# Altium footprint library Connectors THD.PcbLib: 631 footprints (part 25 of 46)
Each footprint in its own frame and in the unit in brackets; x right, y up, seen from the top. Pads: shape width x height; smd on the part's side, far side on the other; paste and mask are expansions set on the pad; w line width, h text height; cw(c..) or ccw(c..) is an arc to the next point about the centre after c.
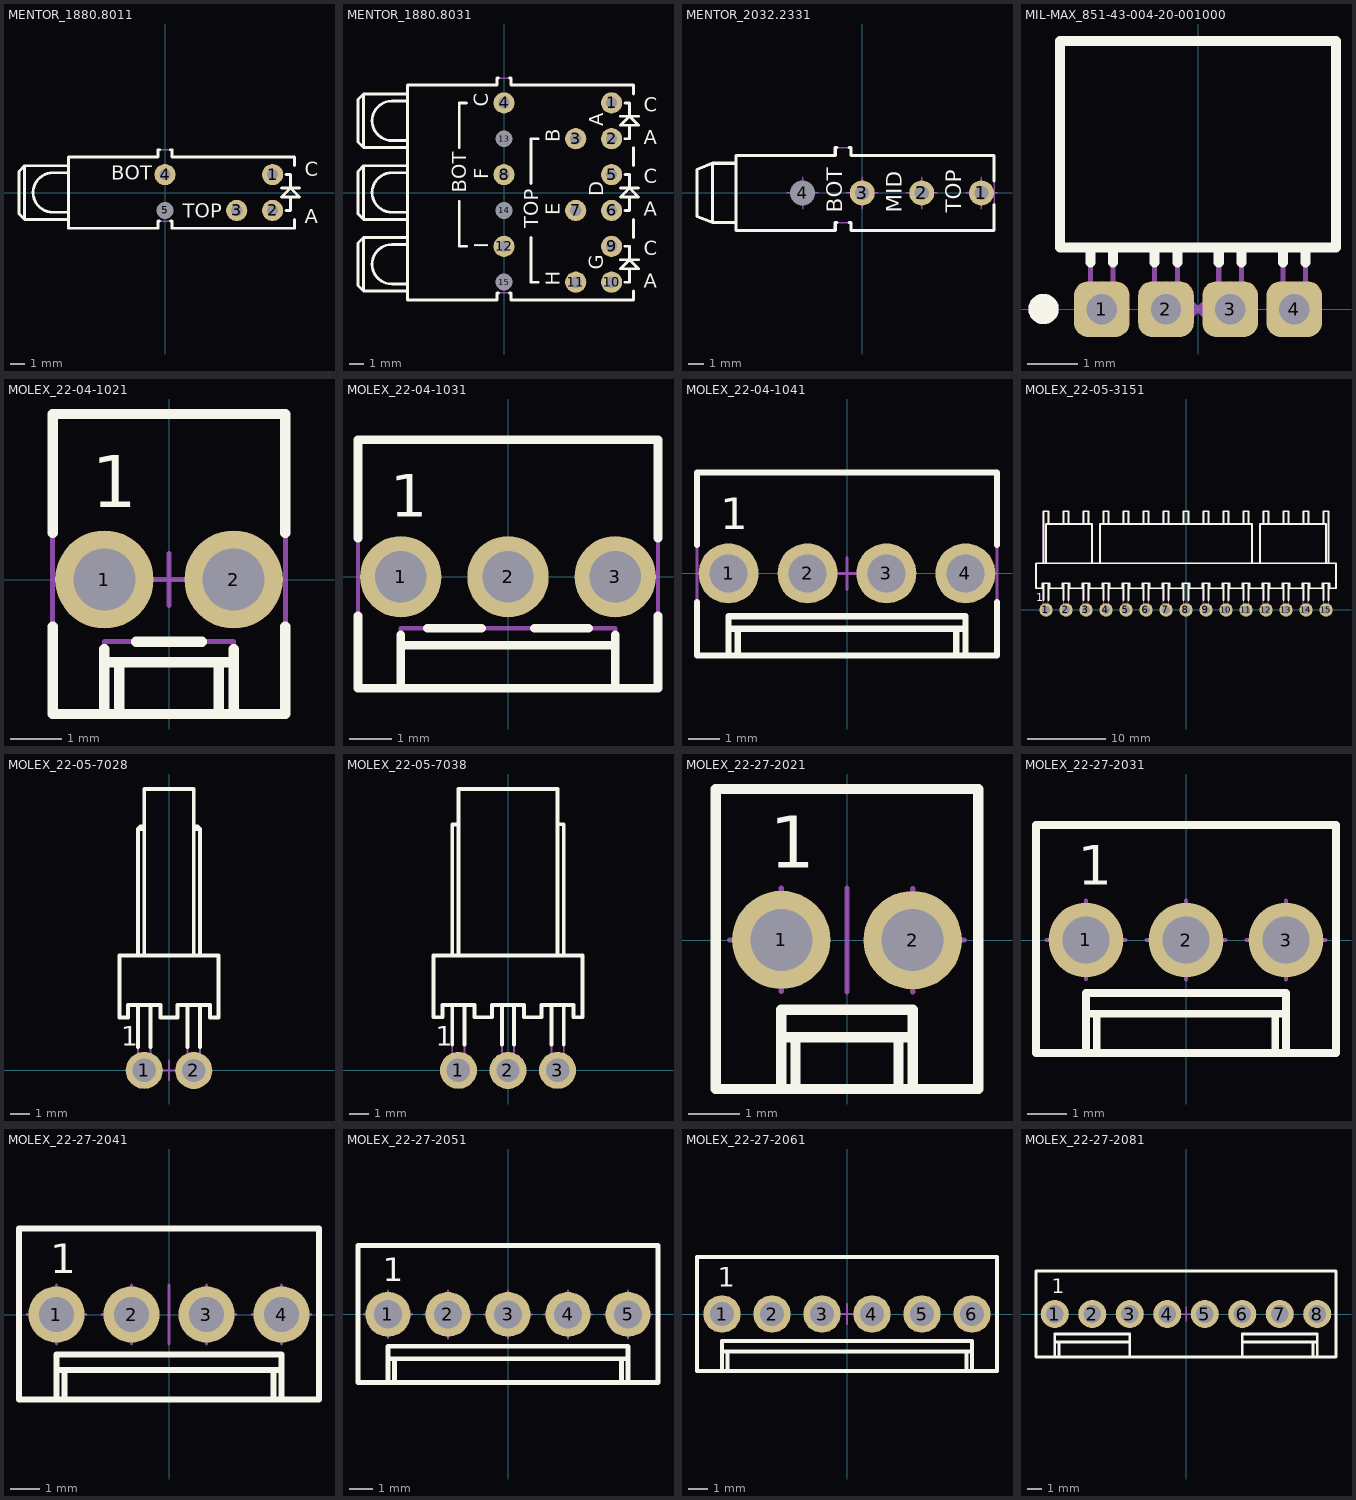
[diagram p24: the footprints below, top view; thin cyan lines are the x and y axes]

## MENTOR_1880.8011 [mm] "2 x Test Jack 2mm + 1 x Green LED 3mm PCB Edge Mounting"
height 15
pads (5):
  round 1.5 hole 0.8: 1(7.62,1.27) 2(7.62,-1.27) 3(5.08,-1.27) 4(0,1.27)
  round 1 hole 1.2 unplated mask+0.2: 5(0,-1.27)
Top Overlay:
  lines w0.2: -6.84,-1.9 -9.94,-1.9 ; -6.84,-1.4 -7.94,-1.4 cw(c-7.94,0) -7.94,1.4 -6.84,1.4 ; -6.84,1.9 -9.94,1.9 ; -0.39,-2.025 -0.5,-2.025 -0.5,-2.525 -6.84,-2.525 -6.84,2.525 -0.5,2.525 -0.5,3.025 -0.39,3.025 ; 0.39,-2.025 0.5,-2.025 0.5,-2.525 9.16,-2.525 9.16,-1.905 ; 0.39,3.025 0.5,3.025 0.5,2.525 9.16,2.525 9.16,1.905 ; 8.255,0.318 9.525,0.318 ; 8.573,-1.27 8.89,-1.27 ; 8.573,1.27 8.89,1.27 8.89,0.318 ; 8.62,-1.27 8.89,-1.27 ; 8.89,-0.318 8.89,-1.27 ; -9.94,-1.9 -9.94,1.9 ; -9.94,-1.9 -10.34,-1.5 -10.34,1.5 -9.94,1.9 ; 8.89,0.318 8.255,-0.318 9.525,-0.318 8.89,0.318
  text "BOT" at -3.81,0.889 h1
  text "TOP" at 1.27,-1.778 h1
  text "A" at 9.906,-2.159 h1
  text "C" at 9.906,1.143 h1
Mechanical 14:
  lines w0.1: -6.84,-1.9 -9.94,-1.9 ; -6.84,1.9 -9.94,1.9 ; 8.255,0.318 9.525,0.318 ; 8.573,-1.27 8.89,-1.27 ; 8.573,1.27 8.89,1.27 8.89,0.318 ; 8.62,-1.27 8.89,-1.27 ; 8.89,-0.318 8.89,-1.27 ; 9.16,-1.905 9.16,-2.525 0.5,-2.525 0.5,-2.025 -0.5,-2.025 -0.5,-2.525 -6.84,-2.525 -6.84,2.525 -0.5,2.525 -0.5,3.025 0.5,3.025 0.5,2.525 9.16,2.525 9.16,1.905 ; -9.94,-1.9 -9.94,1.9 ; -9.94,-1.9 -10.34,-1.5 -10.34,1.5 -9.94,1.9 ; -7.94,-1.4 cw(c-7.94,0) -7.94,1.4 ; -7.94,-1.4 -6.84,-1.4 -7.94,-1.4 ; -7.94,1.4 -6.84,1.4 -7.94,1.4 ; 8.89,0.318 8.255,-0.318 9.525,-0.318 8.89,0.318
  text "A" at 9.906,-2.159 h1
  text "TOP" at 1.27,-1.778 h1
  text "BOT" at -3.81,0.889 h1
  text "C" at 9.906,1.143 h1
3D body: height 15, standoff -3.2, extent -10.3,-2.575 9.2,2.975

## MENTOR_1880.8031 [mm] "6 x Test Jack 2mm + 3 x Green LED 3mm PCB Edge Mounting"
height 15
pads (15):
  round 1.5 hole 0.8: 1(7.62,6.35) 2(7.62,3.81) 3(5.08,3.81) 4(0,6.35) 5(7.62,1.27) 6(7.62,-1.27) 7(5.08,-1.27) 8(0,1.27) 9(7.62,-3.81) 10(7.62,-6.35) 11(5.08,-6.35) 12(0,-3.81)
  round 1 hole 1.2 unplated mask+0.2: 13(0,3.81) 14(0,-1.27) 15(0,-6.35)
Top Overlay:
  lines w0.2: -6.84,-6.98 -9.94,-6.98 ; -6.84,-6.48 -7.94,-6.48 cw(c-7.94,-5.08) -7.94,-3.68 -6.84,-3.68 ; -6.84,-3.18 -9.94,-3.18 ; -6.84,-1.9 -9.94,-1.9 ; -6.84,-1.4 -7.94,-1.4 cw(c-7.94,0) -7.94,1.4 -6.84,1.4 ; -6.84,1.9 -9.94,1.9 ; -6.84,3.18 -9.94,3.18 ; -6.84,3.68 -7.94,3.68 cw(c-7.94,5.08) -7.94,6.48 -6.84,6.48 ; -6.84,6.98 -9.94,6.98 ; -3.175,-0.635 -3.175,-3.81 -2.667,-3.81 ; -3.175,3.175 -3.175,6.35 -2.667,6.35 ; -0.39,-7.105 -0.5,-7.105 -0.5,-7.605 -6.84,-7.605 -6.84,7.605 -0.5,7.605 -0.5,8.105 -0.39,8.105 ; 0.39,-7.105 0.5,-7.105 0.5,-7.605 9.16,-7.605 9.16,-6.985 ; 0.39,8.105 0.5,8.105 0.5,7.605 9.16,7.605 9.16,6.985 ; 1.905,-3.175 1.905,-6.35 2.413,-6.35 ; 1.905,0.635 1.905,3.81 2.413,3.81 ; 8.255,-4.762 9.525,-4.762 ; 8.255,0.318 9.525,0.318 ; 8.255,5.398 9.525,5.398 ; 8.573,-6.35 8.89,-6.35 ; 8.573,-3.81 8.89,-3.81 8.89,-4.762 ; 8.573,-1.27 8.89,-1.27 ; 8.573,1.27 8.89,1.27 8.89,0.318 ; 8.573,3.81 8.89,3.81 ; 8.573,6.35 8.89,6.35 8.89,5.398 ; 8.62,-6.35 8.89,-6.35 ; 8.62,-1.27 8.89,-1.27 ; 8.62,3.81 8.89,3.81 ; 8.89,-5.398 8.89,-6.35 ; 8.89,-0.318 8.89,-1.27 ; 8.89,4.762 8.89,3.81 ; 9.16,-3.175 9.16,-1.905 ; 9.16,1.905 9.16,3.175 ; -9.94,-6.98 -9.94,-3.18 ; -9.94,-6.98 -10.34,-6.58 -10.34,-3.58 -9.94,-3.18 ; -9.94,-1.9 -10.34,-1.5 -10.34,1.5 -9.94,1.9 ; -9.94,-1.9 -9.94,1.9 ; -9.94,3.18 -9.94,6.98 ; -9.94,3.18 -10.34,3.58 -10.34,6.58 -9.94,6.98 ; 8.89,-4.762 8.255,-5.398 9.525,-5.398 8.89,-4.762 ; 8.89,0.318 9.525,-0.318 8.255,-0.318 8.89,0.318 ; 8.89,5.398 8.255,4.762 9.525,4.762 8.89,5.398
  text "BOT" at -2.667,0 h1
  text "C" at -1.116,6.091 h1
  text "I" at -1.116,-3.942 h1
  text "F" at -1.116,0.932 h1
  text "C" at 9.906,0.643 h1
  text "A" at 9.906,-1.659 h1
  text "E" at 3.964,-1.608 h1
  text "H" at 3.964,-6.609 h1
  text "A" at 9.906,-6.739 h1
  text "C" at 9.906,-4.437 h1
  text "B" at 3.964,3.551 h1
  text "A" at 9.906,3.421 h1
  text "C" at 9.906,5.723 h1
  text "A" at 7.012,4.695 h1
  text "D" at 7.012,-0.258 h1
  text "G" at 7.012,-5.465 h1
  text "TOP" at 2.413,-2.54 h1
Mechanical 14:
  lines w0.1: -6.84,-6.98 -9.94,-6.98 ; -6.84,-3.18 -9.94,-3.18 ; -6.84,-1.9 -9.94,-1.9 ; -6.84,1.9 -9.94,1.9 ; -6.84,3.18 -9.94,3.18 ; -6.84,6.98 -9.94,6.98 ; -3.175,-0.635 -3.175,-3.81 -2.667,-3.81 ; -3.175,3.175 -3.175,6.35 -2.667,6.35 ; 1.905,-3.175 1.905,-6.35 2.413,-6.35 ; 1.905,0.635 1.905,3.81 2.413,3.81 ; 8.255,-4.762 9.525,-4.762 ; 8.255,0.318 9.525,0.318 ; 8.255,5.398 9.525,5.398 ; 8.573,-6.35 8.89,-6.35 ; 8.573,-3.81 8.89,-3.81 8.89,-4.762 ; 8.573,-1.27 8.89,-1.27 ; 8.573,1.27 8.89,1.27 8.89,0.318 ; 8.573,3.81 8.89,3.81 ; 8.573,6.35 8.89,6.35 8.89,5.398 ; 8.62,-6.35 8.89,-6.35 ; 8.62,-1.27 8.89,-1.27 ; 8.62,3.81 8.89,3.81 ; 8.89,-5.398 8.89,-6.35 ; 8.89,-0.318 8.89,-1.27 ; 8.89,4.762 8.89,3.81 ; 9.16,-6.985 9.16,-7.605 0.5,-7.605 0.5,-7.105 -0.5,-7.105 -0.5,-7.605 -6.84,-7.605 -6.84,7.605 -0.5,7.605 -0.5,8.105 0.5,8.105 0.5,7.605 9.16,7.605 9.16,6.985 ; 9.16,-3.175 9.16,-1.905 ; 9.16,1.905 9.16,3.175 ; -9.94,-6.98 -9.94,-3.18 ; -9.94,-6.98 -10.34,-6.58 -10.34,-3.58 -9.94,-3.18 ; -9.94,-1.9 -10.34,-1.5 -10.34,1.5 -9.94,1.9 ; -9.94,-1.9 -9.94,1.9 ; -9.94,3.18 -9.94,6.98 ; -9.94,3.18 -10.34,3.58 -10.34,6.58 -9.94,6.98 ; -7.94,-6.48 cw(c-7.94,-5.08) -7.94,-3.68 ; -7.94,-6.48 -6.84,-6.48 -7.94,-6.48 ; -7.94,-3.68 -6.84,-3.68 -7.94,-3.68 ; -7.94,-1.4 cw(c-7.94,0) -7.94,1.4 ; -7.94,-1.4 -6.84,-1.4 -7.94,-1.4 ; -7.94,1.4 -6.84,1.4 -7.94,1.4 ; -7.94,3.68 cw(c-7.94,5.08) -7.94,6.48 ; -7.94,3.68 -6.84,3.68 -7.94,3.68 ; -7.94,6.48 -6.84,6.48 -7.94,6.48 ; 8.89,-4.762 8.255,-5.398 9.525,-5.398 8.89,-4.762 ; 8.89,0.318 9.525,-0.318 8.255,-0.318 8.89,0.318 ; 8.89,5.398 8.255,4.762 9.525,4.762 8.89,5.398
  text "BOT" at -2.667,0 h1
  text "C" at -1.116,6.091 h1
  text "I" at -1.116,-3.942 h1
  text "F" at -1.116,0.932 h1
  text "E" at 3.964,-1.608 h1
  text "A" at 9.906,-1.659 h1
  text "C" at 9.906,0.643 h1
  text "C" at 9.906,-4.437 h1
  text "A" at 9.906,-6.739 h1
  text "H" at 3.964,-6.609 h1
  text "C" at 9.906,5.723 h1
  text "A" at 9.906,3.421 h1
  text "B" at 3.964,3.551 h1
  text "A" at 7.012,4.695 h1
  text "D" at 7.012,-0.258 h1
  text "G" at 7.012,-5.465 h1
  text "TOP" at 2.413,-2.54 h1
3D body: height 15, standoff -3.1, extent -10.34,-7.6 9.16,8.1

## MENTOR_2032.2331 [mm] "3 x Right Angled Test Jack 2mm"
height 15.1
pads (4):
  round 1.6 hole 0.9: 1(7.62,0) 2(3.81,0) 3(0,0)
  round 1.4 hole 1.6 unplated mask+0.2: 4(-3.81,0)
Top Overlay:
  lines w0.2: -8.06,-1.9 -9.56,-1.9 ; -8.06,1.9 -9.56,1.9 ; -1.61,-1.9 -1.72,-1.9 -1.72,-2.4 -8.06,-2.4 -8.06,2.4 -1.72,2.4 -1.72,2.9 -1.61,2.9 ; -0.83,-1.9 -0.72,-1.9 -0.72,-2.4 8.44,-2.4 8.44,-0.75 ; -0.83,2.9 -0.72,2.9 -0.72,2.4 8.44,2.4 8.44,0.75 ; -9.56,-1.9 -9.56,1.9 ; -9.56,-1.9 -10.56,-1.5 -10.56,1.5 -9.56,1.9
  text "BOT" at -1.27,-1.27 h1
  text "TOP" at 6.35,-1.27 h1
  text "MID" at 2.54,-1.27 h1
Mechanical 8:
  lines w0.1: -4.81,0 -3.81,0 ; -3.81,-1 -3.81,0 ; -3.81,1 -3.81,0 ; -2.81,0 -3.81,0 ; -1,0 0,0 ; 0,-1 0,0 ; 0,1 0,0 ; 1,0 0,0 ; 2.81,0 3.81,0 ; 3.81,-1 3.81,0 ; 3.81,1 3.81,0 ; 4.81,0 3.81,0 ; 6.62,0 7.62,0 ; 7.62,-1 7.62,0 ; 7.62,1 7.62,0 ; 8.62,0 7.62,0
Mechanical 14:
  lines w0.1: -8.06,-1.9 -9.56,-1.9 ; -8.06,1.9 -9.56,1.9 ; -9.56,-1.9 -9.56,1.9 ; -9.56,-1.9 -10.56,-1.5 -10.56,1.5 -9.56,1.9 ; -8.06,-2.4 -8.06,2.4 -1.72,2.4 -1.72,2.9 -0.72,2.9 -0.72,2.4 8.44,2.4 8.44,-2.4 -0.72,-2.4 -0.72,-1.9 -1.72,-1.9 -1.72,-2.4 -8.06,-2.4
  text "TOP" at -1.27,-1.27 h1
  text "BOT" at 6.35,-1.27 h1
  text "MID" at 2.54,-1.27 h1
3D body: height 15.1, standoff -3.2, extent -10.56,-2.4 8.44,2.9

## MIL-MAX_851-43-004-20-001000 [mm] "1.27mm Pitch SIL Right Angled Socket"
height 2.21
pads (4):
  rrect50% 1.1x1.1 hole 0.6: 1(-1.905,0) 2(-0.635,0) 3(0.635,0) 4(1.905,0)
Top Overlay:
  circle w0.3: c-3.058,0.003 r0.15
  lines w0.2: -2.129,0.923 -2.129,1.218 ; -1.68,0.923 -1.68,1.218 ; -0.859,0.923 -0.859,1.218 ; -0.41,0.923 -0.41,1.218 ; 0.41,0.923 0.41,1.218 ; 0.86,0.923 0.86,1.218 ; 1.68,0.923 1.68,1.218 ; 2.13,0.923 2.13,1.218 ; -2.731,1.218 -2.73,5.308 0,5.308 2.73,5.308 2.731,1.218 -2.731,1.218
Mechanical 8:
  lines w0.1: -2.405,0 -1.905,0 ; -1.905,-0.5 -1.905,0 ; -1.905,0.5 -1.905,0 ; -1.405,0 -1.905,0 ; -1.135,0 -0.635,0 ; -0.635,-0.5 -0.635,0 ; -0.635,0.5 -0.635,0 ; -0.354,-0.354 0,0 ; -0.354,0.354 0,0 ; -0.135,0 -0.635,0 ; 0.135,0 0.635,0 ; 0.354,-0.354 0,0 ; 0.354,0.354 0,0 ; 0.635,-0.5 0.635,0 ; 0.635,0.5 0.635,0 ; 1.135,0 0.635,0 ; 1.405,0 1.905,0 ; 1.905,-0.5 1.905,0 ; 1.905,0.5 1.905,0 ; 2.405,0 1.905,0
Mechanical 14:
  circle w0.3: c-3.058,0.003 r0.15
  lines w0.1: -2.129,1.218 -2.13,0 ccw(c-1.905,0) -1.68,0 -1.68,1.218 ; -0.859,1.218 -0.86,0 ccw(c-0.635,0) -0.41,0 -0.41,1.218 ; 0.41,1.218 0.41,0 ccw(c0.635,0) 0.86,0 0.86,1.218 ; 1.68,1.218 1.68,0 ccw(c1.905,0) 2.13,0 2.13,1.218 ; -2.731,1.218 -2.73,5.308 0,5.308 2.73,5.308 2.731,1.218 -2.731,1.218
3D body: height 2.21, standoff -3.6, extent -2.73,-0.225 2.731,5.308

## MOLEX_22-04-1021 [mm] "2.5mm (.100\") Pitch KK® Header, Single Row, Vertical, 2 Circuits"
height 11.7
pads (2):
  round 1.9 hole 1.2: 1(-1.25,0) 2(1.25,0)
Top Overlay:
  lines w0.2: -2.25,-0.907 -2.25,-2.6 2.25,-2.6 2.25,-0.907 ; -2.25,0.907 -2.25,3.2 2.25,3.2 2.25,0.907 ; -1.25,-2.6 -1.25,-1.35 ; -1.25,-1.6 1.25,-1.6 ; -0.959,-2.6 -0.959,-1.6 ; -0.632,-1.2 0.632,-1.2 ; 0.959,-2.6 0.959,-1.6 ; 1.25,-2.6 1.25,-1.35
  text "1" at -1.49,1.397 h1
Mechanical 8:
  lines w0.1: -1.75,0 -1.25,0 ; -1.25,-0.5 -1.25,0 ; -1.25,0.5 -1.25,0 ; -0.75,0 -1.25,0 ; -0.5,0 0,0 ; 0,-0.5 0,0 ; 0,0.5 0,0 ; 0.5,0 0,0 ; 0.75,0 1.25,0 ; 1.25,-0.5 1.25,0 ; 1.25,0.5 1.25,0 ; 1.75,0 1.25,0
Mechanical 14:
  lines w0.1: -1.25,-2.6 -1.25,-1.2 1.25,-1.2 1.25,-2.6 ; -1.25,-1.6 1.25,-1.6 ; -0.959,-2.6 -0.959,-1.6 ; 0.959,-2.6 0.959,-1.6 ; -2.25,-2.6 2.25,-2.6 2.25,3.2 -2.25,3.2 -2.25,-2.6 ; -1.568,-0.318 -0.933,-0.318 -0.933,0.318 -1.568,0.318 -1.568,-0.318 ; 0.933,-0.318 0.933,0.318 1.568,0.318 1.568,-0.318 0.933,-0.318
  text "1" at -1.49,1.397 h1
3D body: height 11.7, standoff -3.4, extent -2.25,-2.6 2.25,3.2

## MOLEX_22-04-1031 [mm] "2.5mm (.100\") Pitch KK® Header, Single Row, Vertical, 3 Circuits"
height 11.7
pads (3):
  round 1.9 hole 1.2: 1(-2.5,0) 2(0,0) 3(2.5,0)
Top Overlay:
  lines w0.2: -3.5,-0.907 -3.5,-2.6 3.5,-2.6 3.5,-0.907 ; -3.5,0.907 -3.5,3.2 3.5,3.2 3.5,0.907 ; -2.5,-2.6 -2.5,-1.35 ; -2.5,-1.6 2.5,-1.6 ; -1.882,-1.2 -0.618,-1.2 ; 0.618,-1.2 1.882,-1.2 ; 2.5,-2.6 2.5,-1.35
  text "1" at -2.75,1.4 h1
Mechanical 8:
  lines w0.1: -3,0 -2.5,0 ; -2.5,-0.5 -2.5,0 ; -2.5,0.5 -2.5,0 ; -2,0 -2.5,0 ; -0.5,0 0,0 ; 0,-0.5 0,0 ; 0,0.5 0,0 ; 0.5,0 0,0 ; 2,0 2.5,0 ; 2.5,-0.5 2.5,0 ; 2.5,0.5 2.5,0 ; 3,0 2.5,0
Mechanical 14:
  lines w0.1: -2.5,-2.6 -2.5,-1.2 2.5,-1.2 2.5,-2.6 ; -2.5,-1.6 2.5,-1.6 ; -3.5,-2.6 3.5,-2.6 3.5,3.2 -3.5,3.2 -3.5,-2.6
  text "1" at -2.75,1.4 h1
3D body: height 11.7, standoff -3.4, extent -3.5,-2.6 3.5,3.2

## MOLEX_22-04-1041 [mm] "2.5mm (.100\") Pitch KK® Header, Single Row, Vertical, 4 Circuits"
height 11.7
pads (4):
  round 1.9 hole 1.2: 1(-3.75,0) 2(-1.25,0) 3(1.25,0) 4(3.75,0)
Top Overlay:
  lines w0.2: -4.75,-0.907 -4.75,-2.6 4.75,-2.6 4.75,-0.907 ; -4.75,0.907 -4.75,3.2 4.75,3.2 4.75,0.907 ; -3.75,-2.6 -3.75,-1.35 3.75,-1.35 3.75,-2.6 ; -3.75,-1.75 3.75,-1.75 ; -3.459,-2.6 -3.459,-1.75 ; 3.459,-2.6 3.459,-1.75
  text "1" at -4.02,1.395 h1
Mechanical 8:
  lines w0.1: -4.25,0 -3.75,0 ; -3.75,-0.5 -3.75,0 ; -3.75,0.5 -3.75,0 ; -3.25,0 -3.75,0 ; -1.75,0 -1.25,0 ; -1.25,-0.5 -1.25,0 ; -1.25,0.5 -1.25,0 ; -0.75,0 -1.25,0 ; -0.5,0 0,0 ; 0,-0.5 0,0 ; 0,0.5 0,0 ; 0.5,0 0,0 ; 0.75,0 1.25,0 ; 1.25,-0.5 1.25,0 ; 1.25,0.5 1.25,0 ; 1.75,0 1.25,0 ; 3.25,0 3.75,0 ; 3.75,-0.5 3.75,0 ; 3.75,0.5 3.75,0 ; 4.25,0 3.75,0
Mechanical 14:
  lines w0.1: -3.75,-2.6 -3.75,-1.35 3.75,-1.35 3.75,-2.6 ; -3.75,-1.75 3.75,-1.75 ; -3.459,-2.6 -3.459,-1.75 ; 3.459,-2.6 3.459,-1.75 ; -4.75,-2.6 -4.75,3.2 4.75,3.2 4.75,-2.6 -4.75,-2.6
  text "1" at -4.02,1.395 h1
3D body: height 11.7, standoff -3.4, extent -4.75,-2.6 4.75,3.2

## MOLEX_22-05-3151 [mm] "2.54mm (.100\") Pitch KK® Wire-To-Board Header, Right Angle, With Friction Lock, 15 Circuits"
height 6.6
pads (15):
  round 1.7 hole 1: 1(-17.78,0) 2(-15.24,0) 3(-12.7,0) 4(-10.16,0) 5(-7.62,0) 6(-5.08,0) 7(-2.54,0) 8(0,0) 9(2.54,0) 10(5.08,0) 11(7.62,0) 12(10.16,0) 13(12.7,0) 14(15.24,0) 15(17.78,0)
Top Overlay:
  lines w0.2: -18.098,1.25 -18.098,3.366 ; -18.098,5.906 -18.098,12.51 -17.463,12.51 -17.463,10.909 ; -17.78,5.906 -17.78,10.909 -11.938,10.909 -11.938,5.906 ; -17.463,1.25 -17.463,3.366 ; -15.558,1.25 -15.558,3.366 ; -15.558,10.909 -15.558,12.51 -14.923,12.51 -14.923,10.909 ; -14.923,1.25 -14.923,3.366 ; -13.018,1.25 -13.018,3.366 ; -13.018,10.909 -13.018,12.51 -12.383,12.51 -12.383,10.909 ; -12.383,1.25 -12.383,3.366 ; -10.922,5.906 -10.922,10.909 8.382,10.909 8.382,5.906 ; -10.478,1.25 -10.478,3.366 ; -10.478,10.909 -10.478,12.51 -9.843,12.51 -9.843,10.909 ; -9.843,1.25 -9.843,3.366 ; -7.938,1.25 -7.938,3.366 ; -7.938,10.909 -7.938,12.51 -7.303,12.51 -7.303,10.909 ; -7.303,1.25 -7.303,3.366 ; -5.398,1.25 -5.398,3.366 ; -5.398,10.909 -5.398,12.51 -4.763,12.51 -4.763,10.909 ; -4.763,1.25 -4.763,3.366 ; -2.858,1.25 -2.858,3.366 ; -2.858,10.909 -2.858,12.51 -2.222,12.51 -2.222,10.909 ; -2.222,1.25 -2.222,3.366 ; -0.318,1.25 -0.318,3.366 ; -0.318,10.909 -0.318,12.51 0.318,12.51 0.318,10.909 ; 0.318,1.25 0.318,3.366 ; 2.222,1.25 2.222,3.366 ; 2.222,10.909 2.222,12.51 2.858,12.51 2.858,10.909 ; 2.858,1.25 2.858,3.366 ; 4.763,1.25 4.763,3.366 ; 4.763,10.909 4.763,12.51 5.398,12.51 5.398,10.909 ; 5.398,1.25 5.398,3.366 ; 7.303,1.25 7.303,3.366 ; 7.303,10.909 7.303,12.51 7.938,12.51 7.938,10.909 ; 7.938,1.25 7.938,3.366 ; 9.398,5.906 9.398,10.909 17.78,10.909 17.78,5.906 ; 9.843,1.25 9.843,3.366 ; 9.843,10.909 9.843,12.51 10.478,12.51 10.478,10.909 ; 10.478,1.25 10.478,3.366 ; 12.383,1.25 12.383,3.366 ; 12.383,10.909 12.383,12.51 13.018,12.51 13.018,10.909 ; 13.018,1.25 13.018,3.366 ; 14.923,1.25 14.923,3.366 ; 14.923,10.909 14.923,12.51 15.558,12.51 15.558,10.909 ; 15.558,1.25 15.558,3.366 ; 17.463,1.25 17.463,3.366 ; 17.463,10.909 17.463,12.51 18.098,12.51 18.098,5.906 ; 18.098,1.25 18.098,3.366 ; -19.05,2.731 -18.225,2.731 -18.225,3.366 -17.336,3.366 -17.336,2.731 -15.685,2.731 -15.685,3.366 -14.796,3.366 -14.796,2.731 -13.145,2.731 -13.145,3.366 -12.256,3.366 -12.256,2.731 -10.605,2.731 -10.605,3.366 -9.716,3.366 -9.716,2.731 -8.065,2.731 -8.065,3.366 -7.176,3.366 -7.176,2.731 -5.525,2.731 -5.525,3.366 -4.636,3.366 -4.636,2.731 -2.985,2.731 -2.985,3.366 -2.095,3.366 -2.095,2.731 -0.445,2.731 -0.445,3.366 0.445,3.366 0.445,2.731 2.095,2.731 2.095,3.366 2.985,3.366 2.985,2.731 4.636,2.731 4.636,3.366 5.525,3.366 5.525,2.731 7.176,2.731 7.176,3.366 8.065,3.366 8.065,2.731 9.716,2.731 9.716,3.366 10.605,3.366 10.605,2.731 12.256,2.731 12.256,3.366 13.145,3.366 13.145,2.731 14.796,2.731 14.796,3.366 15.685,3.366 15.685,2.731 17.336,2.731 17.336,3.366 18.225,3.366 18.225,2.731 19.05,2.731 19.05,5.906 -19.05,5.906 -19.05,2.731
  text "1" at -19.028,1.12 h1
Mechanical 8:
  lines w0.1: -18.28,0 -17.78,0 ; -17.78,-0.5 -17.78,0 ; -17.78,0.5 -17.78,0 ; -17.28,0 -17.78,0 ; -15.74,0 -15.24,0 ; -15.24,-0.5 -15.24,0 ; -15.24,0.5 -15.24,0 ; -14.74,0 -15.24,0 ; -13.2,0 -12.7,0 ; -12.7,-0.5 -12.7,0 ; -12.7,0.5 -12.7,0 ; -12.2,0 -12.7,0 ; -10.66,0 -10.16,0 ; -10.16,-0.5 -10.16,0 ; -10.16,0.5 -10.16,0 ; -9.66,0 -10.16,0 ; -8.12,0 -7.62,0 ; -7.62,-0.5 -7.62,0 ; -7.62,0.5 -7.62,0 ; -7.12,0 -7.62,0 ; -5.58,0 -5.08,0 ; -5.08,-0.5 -5.08,0 ; -5.08,0.5 -5.08,0 ; -4.58,0 -5.08,0 ; -3.04,0 -2.54,0 ; -2.54,-0.5 -2.54,0 ; -2.54,0.5 -2.54,0 ; -2.04,0 -2.54,0 ; -0.5,0 0,0 ; 0,-0.5 0,0 ; 0,0.5 0,0 ; 0.5,0 0,0 ; 2.04,0 2.54,0 ; 2.54,-0.5 2.54,0 ; 2.54,0.5 2.54,0 ; 3.04,0 2.54,0 ; 4.58,0 5.08,0 ; 5.08,-0.5 5.08,0 ; 5.08,0.5 5.08,0 ; 5.58,0 5.08,0 ; 7.12,0 7.62,0 ; 7.62,-0.5 7.62,0 ; 7.62,0.5 7.62,0 ; 8.12,0 7.62,0 ; 9.66,0 10.16,0 ; 10.16,-0.5 10.16,0 ; 10.16,0.5 10.16,0 ; 10.66,0 10.16,0 ; 12.2,0 12.7,0 ; 12.7,-0.5 12.7,0 ; 12.7,0.5 12.7,0 ; 13.2,0 12.7,0 ; 14.74,0 15.24,0 ; 15.24,-0.5 15.24,0 ; 15.24,0.5 15.24,0 ; 15.74,0 15.24,0 ; 17.28,0 17.78,0 ; 17.78,-0.5 17.78,0 ; 17.78,0.5 17.78,0 ; 18.28,0 17.78,0
Mechanical 14:
  drawing of 163 lines, arcs and shapes, not listed
  text "1" at -19.028,1.12 h1
3D body: height 6.35, standoff -3.58, extent -19.05,-0.317 19.05,12.51

## MOLEX_22-05-7028 [mm] "2.54mm (.100\") Pitch KK® Wire-To-Board Header, Right Angle, With Friction Lock, 2 Circuits"
height 5.8
pads (2):
  round 1.9 hole 1.2: 1(-1.27,0.002) 2(1.27,-0.002)
Top Overlay:
  lines w0.2: -1.587,1.209 -1.587,3.355 ; -1.587,5.895 -1.587,12.368 ; -1.27,5.895 -1.27,14.42 1.27,14.42 1.27,5.895 ; -1.27,12.368 -1.587,12.368 ; -1.27,12.495 -1.46,12.495 -1.587,12.368 ; -0.953,1.209 -0.953,3.355 ; 0.953,1.209 0.953,3.355 ; 1.27,12.368 1.587,12.368 ; 1.27,12.495 1.46,12.495 1.587,12.368 ; 1.587,1.209 1.587,3.355 ; 1.587,5.895 1.587,12.368 ; -2.54,2.72 -2.095,2.72 -2.095,3.355 -0.445,3.355 -0.445,2.72 0.445,2.72 0.445,3.355 2.095,3.355 2.095,2.72 2.54,2.72 2.54,5.895 -2.54,5.895 -2.54,2.72
  text "1" at -2.442,1.27 h1
Mechanical 8:
  lines w0.1: -1.77,0 -1.27,0 ; -1.27,-0.5 -1.27,0 ; -1.27,0.5 -1.27,0 ; -0.77,0 -1.27,0 ; -0.5,0 0,0 ; 0,-0.5 0,0 ; 0,0.5 0,0 ; 0.5,0 0,0 ; 0.77,0 1.27,0 ; 1.27,-0.5 1.27,0 ; 1.27,0.5 1.27,0 ; 1.77,0 1.27,0
Mechanical 14:
  lines w0.1: -1.587,3.355 -1.587,-0.318 -0.953,-0.318 -0.953,3.355 ; -1.587,5.895 -1.587,12.368 ; -1.27,5.895 -1.27,14.42 1.27,14.42 1.27,5.895 ; -1.27,12.368 -1.587,12.368 ; -1.27,12.495 -1.46,12.495 -1.587,12.368 ; 0.953,3.355 0.953,-0.318 1.587,-0.318 1.587,3.355 ; 1.27,12.368 1.587,12.368 ; 1.27,12.495 1.46,12.495 1.587,12.368 ; 1.587,5.895 1.587,12.368 ; -2.54,2.72 -2.095,2.72 -2.095,3.355 -0.445,3.355 -0.445,2.72 0.445,2.72 0.445,3.355 2.095,3.355 2.095,2.72 2.54,2.72 2.54,5.895 -2.54,5.895 -2.54,2.72
  text "1" at -2.442,1.27 h1
3D body: height 5.84, standoff -3.8, extent -2.54,-0.317 2.54,14.42

## MOLEX_22-05-7038 [mm] "2.54mm (.100\") Pitch KK® Wire-To-Board Header, Right Angle, With Friction Lock, 3 Circuits"
height 5.8
pads (3):
  round 1.9 hole 1.2: 1(-2.54,0) 2(0,-0.005) 3(2.54,0)
Top Overlay:
  lines w0.2: -2.858,1.312 -2.858,3.355 ; -2.858,5.895 -2.858,12.605 -2.54,12.605 ; -2.54,5.895 -2.54,14.42 2.54,14.42 2.54,5.895 ; -2.222,1.312 -2.222,3.355 ; -0.318,1.312 -0.318,3.355 ; 0.318,1.312 0.318,3.355 ; 2.222,1.312 2.222,3.355 ; 2.54,12.634 2.858,12.605 2.858,5.895 ; 2.858,1.312 2.858,3.355 ; -3.81,2.72 -3.81,5.895 ; -3.81,2.72 -3.366,2.72 -3.366,3.355 -1.714,3.355 -1.714,2.72 -0.826,2.72 -0.826,3.355 0.826,3.355 0.826,2.72 1.714,2.72 1.714,3.355 3.366,3.355 3.366,2.72 3.81,2.72 3.81,5.895 -3.81,5.895 ; -3.81,2.72 -3.81,5.895
  text "1" at -3.712,1.268 h1
Mechanical 8:
  lines w0.1: -3.04,0 -2.54,0 ; -2.54,-0.5 -2.54,0 ; -2.54,0.5 -2.54,0 ; -2.04,0 -2.54,0 ; -0.5,0 0,0 ; 0,-0.5 0,0 ; 0,0.5 0,0 ; 0.5,0 0,0 ; 2.04,0 2.54,0 ; 2.54,-0.5 2.54,0 ; 2.54,0.5 2.54,0 ; 3.04,0 2.54,0
Mechanical 14:
  lines w0.1: -2.858,3.355 -2.858,-0.318 -2.222,-0.318 -2.222,3.355 ; -2.858,5.895 -2.858,12.605 -2.54,12.605 ; -2.54,5.895 -2.54,14.42 2.54,14.42 2.54,5.895 ; -0.318,3.355 -0.318,-0.318 0.318,-0.318 0.318,3.355 ; 2.222,3.355 2.222,-0.318 2.858,-0.318 2.858,3.355 ; 2.54,12.634 2.858,12.605 2.858,5.895 ; -3.81,2.72 -3.81,5.895 ; -3.81,2.72 -3.366,2.72 -3.366,3.355 -1.714,3.355 -1.714,2.72 -0.826,2.72 -0.826,3.355 0.826,3.355 0.826,2.72 1.714,2.72 1.714,3.355 3.366,3.355 3.366,2.72 3.81,2.72 3.81,5.895 -3.81,5.895 ; -3.81,2.72 -3.81,5.895
  text "1" at -3.712,1.268 h1
3D body: height 5.84, standoff -3.8, extent -3.81,-0.317 3.81,14.42

## MOLEX_22-27-2021 [mm] "2.54mm (.100\") Pitch KK® Header, Single Row, Vertical, 2 Circuits"
height 11.7
pads (2):
  round 1.9 hole 1.2: 1(-1.27,0.002) 2(1.27,-0.002)
Top Overlay:
  lines w0.2: -1.27,-2.88 -1.27,-1.35 1.27,-1.35 1.27,-2.88 ; -1.27,-1.88 1.27,-1.88 ; -0.997,-2.88 -0.997,-1.88 ; 0.997,-2.88 0.997,-1.88 ; -2.54,-2.88 2.54,-2.88 2.54,2.92 -2.54,2.92 -2.54,-2.88
  text "1" at -1.49,1.397 h1
Mechanical 8:
  lines w0.1: -2.27,0.002 -1.27,0.002 ; -1.27,-0.998 -1.27,0.002 ; -1.27,1.002 -1.27,0.002 ; 0,-1 0,0 0,1 ; 1.27,-1.002 1.27,-0.002 ; 1.27,0.998 1.27,-0.002 ; 2.27,-0.002 1.27,-0.002
Mechanical 14:
  lines w0.1: -1.27,-2.88 -1.27,-1.35 1.27,-1.35 1.27,-2.88 ; -1.27,-1.88 1.27,-1.88 ; -0.997,-2.88 -0.997,-1.88 ; 0.997,-2.88 0.997,-1.88 ; -2.54,-2.88 2.54,-2.88 2.54,2.92 -2.54,2.92 -2.54,-2.88 ; -1.59,-0.315 -0.95,-0.315 -0.95,0.32 -1.59,0.32 -1.59,-0.315 ; 0.95,-0.32 0.95,0.32 1.59,0.32 1.59,-0.32 0.95,-0.32
  text "1" at -1.49,1.397 h1
3D body: height 11.7, standoff -3.56, extent -2.54,-2.88 2.54,2.92

## MOLEX_22-27-2031 [mm] "2.54mm (.100\") Pitch KK® Header, Single Row, Vertical, 3 Circuits"
height 11.7
pads (3):
  round 1.9 hole 1.2: 1(-2.54,0.005) 2(0,0) 3(2.54,0)
Top Overlay:
  lines w0.2: -2.54,-2.873 -2.54,-1.342 2.54,-1.342 2.54,-2.873 ; -2.54,-1.873 2.54,-1.873 ; -2.267,-2.873 -2.267,-1.873 ; 2.267,-2.873 2.267,-1.873 ; -3.81,-2.873 -3.81,2.928 3.81,2.928 3.81,-2.873 -3.81,-2.873
  text "1" at -2.75,1.4 h1
Mechanical 8:
  lines w0.1: -3.54,0.005 -2.54,0.005 ; -2.54,-0.995 -2.54,0.005 ; -2.54,1.005 -2.54,0.005 ; -1.54,0.005 -2.54,0.005 ; -1,0 0,0 ; 0,-1 0,0 ; 0,1 0,0 ; 1,0 0,0 ; 1.54,0 2.54,0 ; 2.54,-1 2.54,0 ; 2.54,1 2.54,0 ; 3.54,0 2.54,0
Mechanical 14:
  lines w0.1: -2.86,-0.312 -2.22,-0.312 -2.22,0.327 -2.86,0.327 -2.86,-0.308 ; -2.54,-2.873 -2.54,-1.342 2.54,-1.342 2.54,-2.873 ; -2.54,-1.873 2.54,-1.873 ; -2.267,-2.873 -2.267,-1.873 ; -0.32,-0.318 0.32,-0.318 0.32,0.323 -0.32,0.323 -0.32,-0.312 ; 2.22,-0.318 2.86,-0.318 2.86,0.323 2.22,0.323 2.22,-0.312 ; 2.267,-2.873 2.267,-1.873 ; -3.81,-2.873 -3.81,2.928 3.81,2.928 3.81,-2.873 -3.81,-2.873
  text "1" at -2.75,1.4 h1
3D body: height 11.7, standoff -3.56, extent -3.81,-2.873 3.81,2.927

## MOLEX_22-27-2041 [mm] "2.54mm (.100\") Pitch KK® Header, Single Row, Vertical, 4 Circuits"
height 11.7
pads (4):
  round 1.9 hole 1.2: 1(-3.81,0) 2(-1.27,0) 3(1.27,0) 4(3.81,0)
Top Overlay:
  lines w0.2: -3.81,-2.883 -3.81,-1.353 3.81,-1.353 3.81,-2.883 ; -3.81,-1.883 3.81,-1.883 ; -3.537,-2.883 -3.537,-1.883 ; 3.537,-2.883 3.537,-1.883 ; -5.08,-2.883 5.08,-2.883 5.08,2.918 -5.08,2.918 -5.08,-2.883
  text "1" at -4.02,1.395 h1
Mechanical 8:
  lines w0.1: -4.81,0 -3.81,0 ; -3.81,-1 -3.81,0 ; -3.81,1 -3.81,0 ; -2.81,0 -3.81,0 ; -2.27,0 -1.27,0 ; -1.27,-1 -1.27,0 ; -1.27,1 -1.27,0 ; 0,-1 0,0 0,1 ; 1.27,-1 1.27,0 ; 1.27,1 1.27,0 ; 2.27,0 1.27,0 ; 2.81,0 3.81,0 ; 3.81,-1 3.81,0 ; 3.81,1 3.81,0 ; 4.81,0 3.81,0
Mechanical 14:
  lines w0.1: -3.81,-2.883 -3.81,-1.353 3.81,-1.353 3.81,-2.883 ; -3.81,-1.883 3.81,-1.883 ; -3.537,-2.883 -3.537,-1.883 ; 3.537,-2.883 3.537,-1.883 ; -5.08,-2.883 5.08,-2.883 5.08,2.918 -5.08,2.918 -5.08,-2.883 ; -4.13,-0.318 -4.13,0.318 -3.49,0.318 -3.49,-0.318 -4.13,-0.318 ; -1.59,-0.318 -1.59,0.318 -0.95,0.318 -0.95,-0.318 -1.59,-0.318 ; 0.95,-0.318 0.95,0.318 1.59,0.318 1.59,-0.318 0.95,-0.318 ; 3.49,-0.318 3.49,0.318 4.13,0.318 4.13,-0.318 3.49,-0.318
  text "1" at -4.02,1.395 h1
3D body: height 11.7, standoff -3.56, extent -5.08,-2.883 5.08,2.917

## MOLEX_22-27-2051 [mm] "2.54mm (.100\") Pitch KK® Header, Single Row, Vertical, 5 Circuits"
height 11.7
pads (5):
  round 1.9 hole 1.2: 1(-5.08,0.005) 2(-2.54,0) 3(0,0) 4(2.54,0) 5(5.08,0)
Top Overlay:
  lines w0.2: -5.08,-2.88 -5.08,-1.35 5.08,-1.35 5.08,-2.88 ; -5.08,-1.88 5.08,-1.88 ; -4.807,-2.88 -4.807,-1.88 ; 4.807,-2.88 4.807,-1.88 ; -6.35,-2.88 -6.35,2.92 6.35,2.92 6.35,-2.88 -6.35,-2.88
  text "1" at -5.3,1.4 h1
Mechanical 8:
  lines w0.1: -6.08,0.005 -5.08,0.005 ; -5.08,-0.995 -5.08,0.005 ; -5.08,1.005 -5.08,0.005 ; -4.08,0.005 -5.08,0.005 ; -3.54,0 -2.54,0 ; -2.54,-1 -2.54,0 ; -2.54,1 -2.54,0 ; -1.54,0 -2.54,0 ; -1,0 0,0 ; 0,-1 0,0 ; 0,1 0,0 ; 1,0 0,0 ; 1.54,0 2.54,0 ; 2.54,-1 2.54,0 ; 2.54,1 2.54,0 ; 3.54,0 2.54,0 ; 4.08,0 5.08,0 ; 5.08,-1 5.08,0 ; 5.08,1 5.08,0 ; 6.08,0 5.08,0
Mechanical 14:
  lines w0.1: -5.08,-2.88 -5.08,-1.35 5.08,-1.35 5.08,-2.88 ; -5.08,-1.88 5.08,-1.88 ; -4.807,-2.88 -4.807,-1.88 ; 4.807,-2.88 4.807,-1.88 ; -6.35,-2.88 -6.35,2.92 6.35,2.92 6.35,-2.88 -6.35,-2.88 ; -5.4,-0.315 -4.76,-0.315 -4.76,0.325 -5.4,0.325 -5.4,-0.315 ; -2.86,-0.32 -2.86,0.32 -2.22,0.32 -2.22,-0.32 -2.86,-0.32 ; -0.32,-0.32 0.32,-0.32 0.32,0.32 -0.32,0.32 -0.32,-0.32 ; 2.22,-0.32 2.86,-0.32 2.86,0.32 2.22,0.32 2.22,-0.32 ; 4.76,-0.32 5.4,-0.32 5.4,0.32 4.76,0.32 4.76,-0.32
  text "1" at -5.3,1.4 h1
3D body: height 11.7, standoff -3.56, extent -6.35,-2.88 6.35,2.92

## MOLEX_22-27-2061 [mm] "2.54mm (.100\") Pitch KK® Header, Single Row, Vertical, 6 Circuits"
height 11.7
pads (6):
  round 1.9 hole 1.2: 1(-6.35,0) 2(-3.81,0) 3(-1.27,0) 4(1.27,0) 5(3.81,0) 6(6.35,0)
Top Overlay:
  lines w0.2: -6.35,-2.9 -6.35,-1.37 6.35,-1.37 6.35,-2.9 ; -6.35,-1.9 6.35,-1.9 ; -6.077,-2.9 -6.077,-1.9 ; 6.077,-2.9 6.077,-1.9 ; -7.62,-2.9 -7.62,2.9 7.62,2.9 7.62,-2.9 -7.62,-2.9
  text "1" at -6.57,1.395 h1
Mechanical 8:
  lines w0.1: -6.85,0 -6.35,0 ; -6.35,-0.5 -6.35,0 ; -6.35,0.5 -6.35,0 ; -5.85,0 -6.35,0 ; -4.31,0 -3.81,0 ; -3.81,-0.5 -3.81,0 ; -3.81,0.5 -3.81,0 ; -3.31,0 -3.81,0 ; -1.77,0 -1.27,0 ; -1.27,-0.5 -1.27,0 ; -1.27,0.5 -1.27,0 ; -0.77,0 -1.27,0 ; -0.5,0 0,0 ; 0,-0.5 0,0 ; 0,0.5 0,0 ; 0.5,0 0,0 ; 0.77,0 1.27,0 ; 1.27,-0.5 1.27,0 ; 1.27,0.5 1.27,0 ; 1.77,0 1.27,0 ; 3.31,0 3.81,0 ; 3.81,-0.5 3.81,0 ; 3.81,0.5 3.81,0 ; 4.31,0 3.81,0 ; 5.85,0 6.35,0 ; 6.35,-0.5 6.35,0 ; 6.35,0.5 6.35,0 ; 6.85,0 6.35,0
Mechanical 14:
  lines w0.1: -6.35,-2.9 -6.35,-1.37 6.35,-1.37 6.35,-2.9 ; -6.35,-1.9 6.35,-1.9 ; -6.077,-2.9 -6.077,-1.9 ; 6.077,-2.9 6.077,-1.9 ; -7.62,-2.9 -7.62,2.9 7.62,2.9 7.62,-2.9 -7.62,-2.9 ; -6.67,-0.34 -6.03,-0.34 -6.03,0.3 -6.67,0.3 -6.67,-0.34 ; -4.13,-0.34 -4.13,0.3 -3.49,0.3 -3.49,-0.34 -4.13,-0.34 ; -1.59,-0.34 -0.95,-0.34 -0.95,0.3 -1.59,0.3 -1.59,-0.34 ; 0.95,-0.34 1.59,-0.34 1.59,0.3 0.95,0.3 0.95,-0.34 ; 3.49,-0.34 3.49,0.3 4.13,0.3 4.13,-0.34 3.49,-0.34 ; 6.03,-0.34 6.03,0.3 6.67,0.3 6.67,-0.34 6.03,-0.34
  text "1" at -6.57,1.395 h1
3D body: height 11.7, standoff -3.56, extent -7.62,-2.9 7.62,2.9

## MOLEX_22-27-2081 [mm] "2.54mm (.100\") Pitch KK® Header, Single Row, Vertical, 8 Circuits"
height 11.7
pads (8):
  round 1.9 hole 1.2: 1(-8.89,0) 2(-6.35,0) 3(-3.81,0) 4(-1.27,0) 5(1.27,0) 6(3.81,0) 7(6.35,0) 8(8.89,0)
Top Overlay:
  lines w0.2: -8.89,-2.9 -8.89,-1.37 -3.81,-1.37 -3.81,-2.9 ; -8.89,-1.9 -3.81,-1.9 ; -8.617,-2.9 -8.617,-1.9 ; 3.81,-2.9 3.81,-1.37 8.89,-1.37 8.89,-2.9 ; 3.81,-1.9 8.89,-1.9 ; 8.617,-2.9 8.617,-1.9 ; -10.16,-2.9 -10.16,2.9 10.16,2.9 10.16,-2.9 -10.16,-2.9
  text "1" at -9.11,1.395 h1
Mechanical 8:
  lines w0.1: -9.39,0 -8.89,0 ; -8.89,-0.5 -8.89,0 ; -8.89,0.5 -8.89,0 ; -8.39,0 -8.89,0 ; -6.85,0 -6.35,0 ; -6.35,-0.5 -6.35,0 ; -6.35,0.5 -6.35,0 ; -5.85,0 -6.35,0 ; -4.31,0 -3.81,0 ; -3.81,-0.5 -3.81,0 ; -3.81,0.5 -3.81,0 ; -3.31,0 -3.81,0 ; -1.77,0 -1.27,0 ; -1.27,-0.5 -1.27,0 ; -1.27,0.5 -1.27,0 ; -0.77,0 -1.27,0 ; -0.5,0 0,0 ; 0,-0.5 0,0 ; 0,0.5 0,0 ; 0.5,0 0,0 ; 0.77,0 1.27,0 ; 1.27,-0.5 1.27,0 ; 1.27,0.5 1.27,0 ; 1.77,0 1.27,0 ; 3.31,0 3.81,0 ; 3.81,-0.5 3.81,0 ; 3.81,0.5 3.81,0 ; 4.31,0 3.81,0 ; 5.85,0 6.35,0 ; 6.35,-0.5 6.35,0 ; 6.35,0.5 6.35,0 ; 6.85,0 6.35,0 ; 8.39,0 8.89,0 ; 8.89,-0.5 8.89,0 ; 8.89,0.5 8.89,0 ; 9.39,0 8.89,0
Mechanical 14:
  lines w0.1: -8.89,-2.9 -8.89,-1.37 -3.81,-1.37 -3.81,-2.9 ; -8.89,-1.9 -3.81,-1.9 ; -8.617,-2.9 -8.617,-1.9 ; 3.81,-2.9 3.81,-1.37 8.89,-1.37 8.89,-2.9 ; 3.81,-1.9 8.89,-1.9 ; 8.617,-2.9 8.617,-1.9 ; -10.16,-2.9 -10.16,2.9 10.16,2.9 10.16,-2.9 -10.16,-2.9 ; -9.21,-0.34 -8.57,-0.34 -8.57,0.3 -9.21,0.3 -9.21,-0.34 ; -6.67,-0.34 -6.67,0.3 -6.03,0.3 -6.03,-0.34 -6.67,-0.34 ; -4.13,-0.34 -3.49,-0.34 -3.49,0.3 -4.13,0.3 -4.13,-0.34 ; -1.59,-0.34 -0.95,-0.34 -0.95,0.3 -1.59,0.3 -1.59,-0.34 ; 0.95,-0.34 0.95,0.3 1.59,0.3 1.59,-0.34 0.95,-0.34 ; 3.49,-0.34 3.49,0.3 4.13,0.3 4.13,-0.34 3.49,-0.34 ; 6.03,-0.34 6.03,0.3 6.67,0.3 6.67,-0.34 6.03,-0.34 ; 8.57,-0.34 8.57,0.3 9.21,0.3 9.21,-0.34 8.57,-0.34
  text "1" at -9.11,1.395 h1
3D body: height 11.7, standoff -3.56, extent -10.16,-2.9 10.16,2.9